# Altium footprint library 1.27MM_插针.PcbLib: 38 footprints (part 3 of 3)
Each footprint in its own frame and in the unit in brackets; x right, y up, seen from the top. Pads: shape width x height; smd on the part's side, far side on the other; paste and mask are expansions set on the pad; w line width, h text height; cw(c..) or ccw(c..) is an arc to the next point about the centre after c.
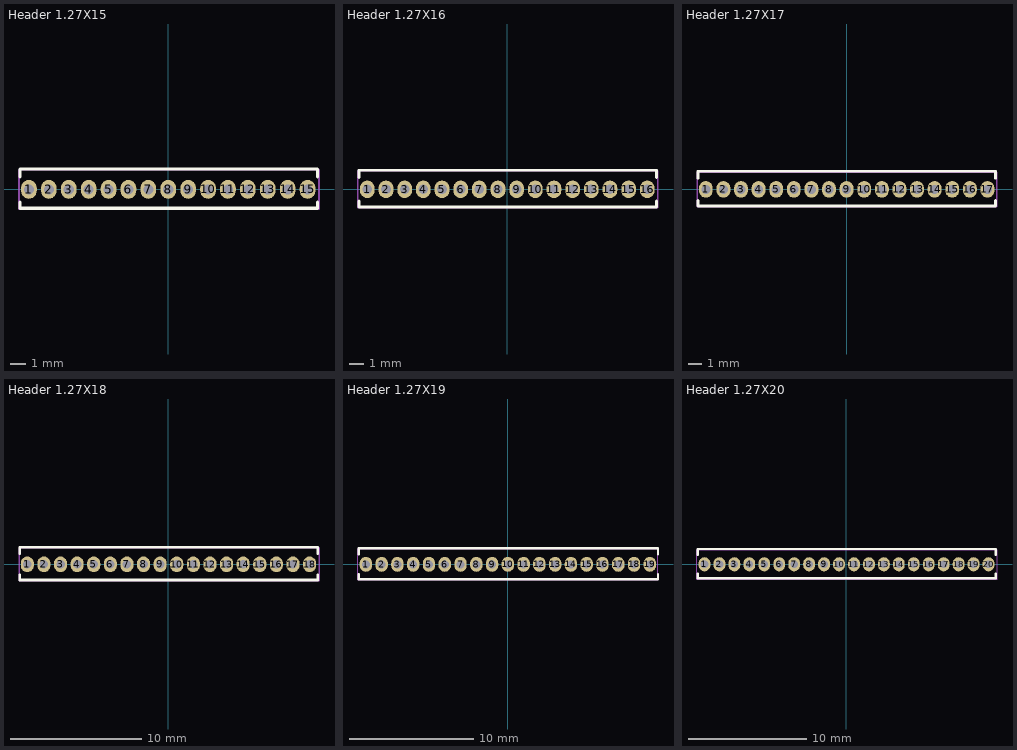
[diagram p2: the footprints below, top view; thin cyan lines are the x and y axes]

## Header 1.27X15 [mm]
pads (15):
  oval 1x1.2 hole 0.65: 1(-8.89,0) 2(-7.62,0) 3(-6.35,0) 4(-5.08,0) 5(-3.81,0) 6(-2.54,0) 7(-1.27,0) 8(0,0) 9(1.27,0) 10(2.54,0) 11(3.81,0) 12(5.08,0) 13(6.35,0) 14(7.62,0) 15(8.89,0)
Top Overlay:
  lines w0.2: -9.455,-0.8 -9.455,-1.2 9.52,-1.2 9.52,-0.8 ; -9.455,0.8 -9.455,1.3 9.52,1.3 9.52,0.8
Mechanical 15:
  lines w0.1: -9.525,-1.25 -9.525,1.25 9.62,1.25 9.62,-1.25 -9.525,-1.25
3D body "HEADER 1.27X15.STEP": height 5.34, standoff -2.6, extent -9.495,-1.25 9.555,1.25

## Header 1.27X16 [mm]
pads (16):
  oval 1x1.2 hole 0.65: 1(-9.525,0) 2(-8.255,0) 3(-6.985,0) 4(-5.715,0) 5(-4.445,0) 6(-3.175,0) 7(-1.905,0) 8(-0.635,0) 9(0.635,0) 10(1.905,0) 11(3.175,0) 12(4.445,0) 13(5.715,0) 14(6.985,0) 15(8.255,0) 16(9.525,0)
Top Overlay:
  lines w0.2: -10.09,-0.8 -10.09,-1.2 10.155,-1.2 10.155,-0.8 ; -10.09,0.8 -10.09,1.3 10.155,1.3 10.155,0.8
Mechanical 15:
  lines w0.1: -10.16,-1.25 10.255,-1.25 10.255,1.25 -10.16,1.25 -10.16,-1.25
3D body "HEADER 1.27X16.STEP": height 5.34, standoff -2.6, extent -10.13,-1.25 10.19,1.25

## Header 1.27X17 [mm]
pads (17):
  oval 1x1.2 hole 0.65: 1(-10.16,0) 2(-8.89,0) 3(-7.62,0) 4(-6.35,0) 5(-5.08,0) 6(-3.81,0) 7(-2.54,0) 8(-1.27,0) 9(0,0) 10(1.27,0) 11(2.54,0) 12(3.81,0) 13(5.08,0) 14(6.35,0) 15(7.62,0) 16(8.89,0) 17(10.16,0)
Top Overlay:
  lines w0.2: -10.725,-0.8 -10.725,-1.2 10.75,-1.2 10.75,-0.8 ; -10.725,0.8 -10.725,1.3 10.75,1.3 10.75,0.8
Mechanical 15:
  lines w0.1: -10.795,-1.25 -10.795,1.25 10.85,1.25 10.85,-1.25 -10.795,-1.25
3D body "HEADER 1.27X17.STEP": height 5.34, standoff -2.6, extent -10.765,-1.25 10.825,1.25

## Header 1.27X18 [mm]
pads (18):
  oval 1x1.2 hole 0.65: 1(-10.795,0) 2(-9.525,0) 3(-8.255,0) 4(-6.985,0) 5(-5.715,0) 6(-4.445,0) 7(-3.175,0) 8(-1.905,0) 9(-0.635,0) 10(0.635,0) 11(1.905,0) 12(3.175,0) 13(4.445,0) 14(5.715,0) 15(6.985,0) 16(8.255,0) 17(9.525,0) 18(10.795,0)
Top Overlay:
  lines w0.2: -11.36,-0.8 -11.36,-1.2 11.415,-1.2 11.415,-0.8 ; -11.36,0.8 -11.36,1.3 11.415,1.3 11.415,0.8
Mechanical 15:
  lines w0.1: -11.43,-1.25 11.515,-1.25 11.515,1.25 -11.43,1.25 -11.43,-1.25
3D body "HEADER 1.27X18.STEP": height 5.34, standoff -2.6, extent -11.4,-1.25 11.46,1.25

## Header 1.27X19 [mm]
pads (19):
  oval 1x1.2 hole 0.65: 1(-11.43,0) 2(-10.16,0) 3(-8.89,0) 4(-7.62,0) 5(-6.35,0) 6(-5.08,0) 7(-3.81,0) 8(-2.54,0) 9(-1.27,0) 10(0,0) 11(1.27,0) 12(2.54,0) 13(3.81,0) 14(5.08,0) 15(6.35,0) 16(7.62,0) 17(8.89,0) 18(10.16,0) 19(11.43,0)
Top Overlay:
  lines w0.2: -11.995,-0.8 -11.995,-1.2 12.09,-1.2 12.09,-0.8 ; -11.995,0.8 -11.995,1.3 12.09,1.3 12.09,0.8
Mechanical 15:
  lines w0.1: -12.065,-1.25 -12.065,1.25 12.09,1.25 12.09,-1.25 -12.065,-1.25
3D body "HEADER 1.27X19.STEP": height 5.34, standoff -2.6, extent -12.035,-1.25 12.095,1.25

## Header 1.27X20 [mm]
pads (20):
  oval 1x1.2 hole 0.65: 1(-12.065,0) 2(-10.795,0) 3(-9.525,0) 4(-8.255,0) 5(-6.985,0) 6(-5.715,0) 7(-4.445,0) 8(-3.175,0) 9(-1.905,0) 10(-0.635,0) 11(0.635,0) 12(1.905,0) 13(3.175,0) 14(4.445,0) 15(5.715,0) 16(6.985,0) 17(8.255,0) 18(9.525,0) 19(10.795,0) 20(12.065,0)
Top Overlay:
  lines w0.2: -12.63,-0.8 -12.63,-1.2 12.685,-1.2 12.685,-0.8 ; -12.63,0.8 -12.63,1.3 12.685,1.3 12.685,0.8
Mechanical 15:
  lines w0.1: -12.7,-1.25 12.785,-1.25 12.785,1.25 -12.7,1.25 -12.7,-1.25
3D body "HEADER 1.27X20.STEP": height 5.34, standoff -2.6, extent -12.67,-1.25 12.73,1.25